# Altium integrated library CbyP.IntLib: 1144 symbols (part 5 of 6) (continued)
## LM3914N-1/NOPB (continued)

## LP28300AQVF
designator IC?
20V 6A 25mΩ@4.5V,4A 1W 1V@250uA 2 N-Channel TSSOP-8 MOSFETs ROHS; Manufacturer: LOWPOWER; So_Chan_Dan: 11; So_Chan_Cam: 0; Package: TDFN-10-EP(3x3); Name: LP28300AQVF; Mfr.Part #: LP28300AQVF
footprint TDFN-10-EP(3x3)
pins: 1 REG, 2 VIN, 3 PMID (power), 4 SW (power), 5 GND (power), 6 NTC, 7 STAT, 8 BST, 9 BAT, 10 RS, 11 GND

## LR1121IMLTRT
designator IC?
Long Range, Low Power, Multi-band LoRa Transceiver; Manufacturer: SEMTECH; Mfr.Part #: LR1121IMLTRT; LCSC Part #: C7498014; Package: QFN-32-EP(5x5)
footprint QFN-32-EP(5x5)
pins: 1 VR_PA, 2 VBAT_RF, 3 VTCXO, 4 XTA, 5 XTB, 6 ~{RESET}, 7 32K_P/DIO11, 8 32K_N/DIO10, 9 DIO9, 10 DIO8, 11 DIO7, 12 VREG, 13 GND, 14 DCC_SW, 15 VBAT, 16 DNC, 17 DNC, 18 DNC, 19 DIO6, 20 DIO5, 21 DIO4, 22 DIO3, 23 DIO2, 24 DIO1, 25 DIO0/BUSY, 26 RFIO_HF, 27 DNC, 28 DNC, 29 RFI_N_LF0, 30 RFI_P_LF0, 31 RFO_LP_LF, 32 RFO_HP_LF, 33 GND

## MAX232DR
designator IC?, comment MAX232D
120Kbps Transceiver SOIC-16 RS232 ICs ROHS; Manufacturer: Texas Instruments; Mfr.Part #: MAX232DR; Package: SOIC-16; LCSC Part #: C158068; DigiKey Part Number: 296-14619-2-ND
footprint SOIC-16
pins: 1 C1+, 2 VS+, 3 C1-, 4 C2+, 5 C2-, 6 VS-, 7 T2OUT, 8 R2IN, 9 R2OUT, 10 T2IN, 11 T1IN, 12 R1OUT, 13 R1IN, 14 T1OUT, 15 GND, 16 VCC

## MAX232ESE+T-JSM
designator IC?, comment MAX232
Transceiver 3V~5.5V SOP-16 Drivers, Receivers, Transceivers RoHS; Manufacturer: JSMSEMI; Mfr.Part #: MAX232ESE+T-JSM; Package: SOP-16; LCSC Part #: C41421781; DigiKey Part Number: NO
footprint SOIC-16
pins: 1 C1+, 2 VS+, 3 C1-, 4 C2+, 5 C2-, 6 VS-, 7 DOUT2, 8 RIN2, 9 ROUT2, 10 DIN2, 11 DIN1, 12 ROUT1, 13 RIN1, 14 DOUT1, 15 GND, 16 VCC

## MAX485ESA+T
designator IC?, comment MAX485
Transceiver 4.75V~5.25V SOIC-8 Drivers, Receivers, Transceivers RoHS; Manufacturer: MAXIM; Mfr.Part #: MAX485ESA+T; Package: SOIC-8; LCSC Part #: C19738; DigiKey Part Number: MAX485ESA+TTR-ND
footprint SOIC-8
pins: 1 RO, 2 RE#, 3 DE, 4 DI, 5 GND, 6 A, 7 B, 8 VCC

## MAX3485EESA+T
designator IC?, comment MAX3485
Transceiver Half-Duplex 3V~3.6V SOIC-8 Drivers, Receivers, Transceivers RoHS; Manufacturer: MAXIM; Mfr.Part #: MAX3485EESA+T; Package: SOIC-8; LCSC Part #: C9943; DigiKey Part Number: MAX3485EESA+TTR-ND
footprint SOIC-8
pins: 1 RO, 2 RE#, 3 DE, 4 DI, 5 GND, 6 A, 7 B, 8 VCC

## MAX98357AETE+T
designator IC?, comment MAX98357A
Tiny, Low-Cost, PCM Class D Amplifier with Class AB Performance; Manufacturer: MAXIM; Mfr.Part #: MAX98357AETE+T; Package: TQFN-16-EP(3x3); LCSC Part #: C910544
footprint TQFN-16-EP(3x3)
pins: 1 DIN, 2 GAIN_SLOT, 3 GND, 4 ~{SD_MODE}, 5 NC, 6 NC, 7 VDD, 8 VDD, 9 OUTP, 10 OUTN, 11 GND, 12 NC, 13 NC, 14 LRCLK, 15 GND, 16 BCLK, 17 GND

## MCP3204
designator IC?
12 Bits 2.7V~5.5V 100kHz SOIC-14 Analog to Digital Converters (ADC) ROHS; Manufacturer: Microchip Tech; Mfr.Part #: MCP3204-CI/SL; So_Chan_Dan: 14; So_Chna_Cam: 0; Package: SOIC-14; Name: MCP3204
footprint SOP-14
pins: 1 CH0, 2 CH1, 3 CH2, 4 CH3, 5 NC, 6 NC, 7 DGND, 8 CS#/SHDN, 9 DIN, 10 DOUT, 11 CLK, 12 AGND, 13 VREF, 14 VDD

## MIC4424YM
designator IC?
Low Edge 2 MOSFET 3A 28ns 32ns 4.5V~18V 3A SOIC-8 Gate Drivers ROHS; Manufacturer: Microchip Tech; Mfr.Part #: MIC4424YM-TR; So_Chan_Dan: 8; So_Chan_Cam: 0; Package: SOIC-8
footprint SOIC-8
pins: 1 NC, 2 INA, 3 GND, 4 INB, 5 OUTB, 6 VS, 7 OUTA, 8 NC

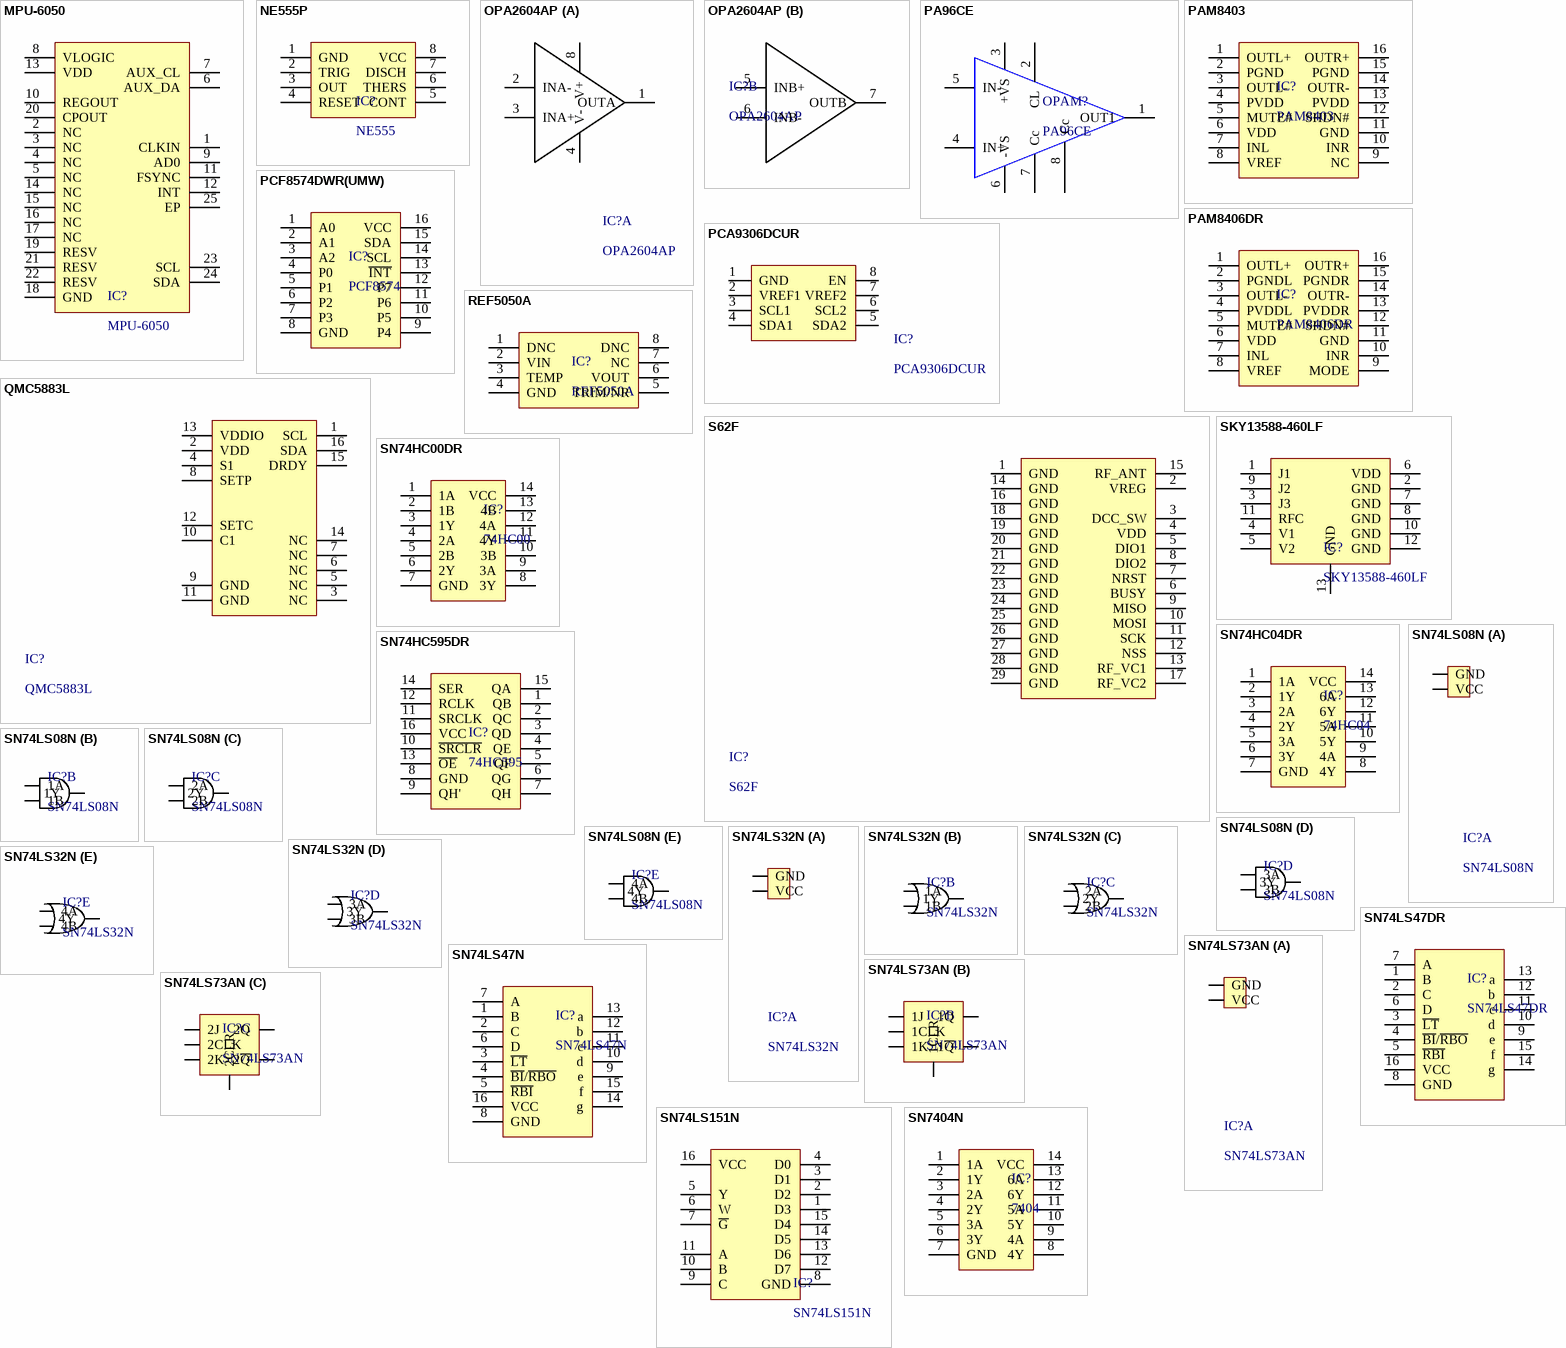
[diagram p29: symbols MPU-6050 to SN7404N]

## MPU-6050
designator IC?
Accelerometer gyroscope QFN-24-EP(4x4) Accelerometers ROHS; Manufacturer: TDK InvenSense; So_Chan_Dan: 25; So_.Chan_Cam: 0; Mfr.Part #: MPU-6050; Package: QFN-24-EP(4x4); Name: MPU-6050
footprint QFN-24-EP(4x4)
pins: 1 CLKIN, 2 NC, 3 NC, 4 NC, 5 NC, 6 AUX_DA, 7 AUX_CL, 8 VLOGIC, 9 AD0, 10 REGOUT, 11 FSYNC, 12 INT, 13 VDD, 14 NC, 15 NC, 16 NC, 17 NC, 18 GND, 19 RESV, 20 CPOUT, 21 RESV, 22 RESV, 23 SCL, 24 SDA, 25 EP

## NE555P
designator IC?, comment NE555
100kHz DIP-8 Timers / Counters ROHS; Manufacturer: Texas Instruments; Mfr.Part #: NE555P; So_Chan_Dan: 0; So_.Chan_Cam: 6; ComponentLink1Description: New link; ComponentLink1URL: https://www.lcsc.com/product-detail/Timers-Clock-Oscillators_Texas-Instruments-NE555D_C234230.html; Package: DIP-8; Name: NE555
footprint DIP-8
pins: 1 GND, 2 TRIG, 3 OUT, 4 RESET, 5 CONT, 6 THERS, 7 DISCH, 8 VCC

## OPA2604AP
designator IC?
20MHz DIP-8 FET Input Amplifiers ROHS; Manufacturer: Texas Instruments; So_Chan_Dan: 0; So_Chan_Cam: 8; Mfr.Part #: OPA2604AP; Package: DIP-8; Name: OPA2604AP
footprint DIP-8
footprint SOIC-8
part A pins: 1 OUTA, 2 INA-, 3 INA+, 4 V-, 8 V+
part B pins: 5 INB+, 6 INB-, 7 OUTB

## PA96CE
designator OPAM?
TO-3-8 Amplifiers RoHS; Manufacturer: APEX; Package: TO-3-8; Mfr.Part #: PA96CE; LCSC Part #: C18213792; ComponentLink1Description: Link; ComponentLink1URL: https://www.lcsc.com/product-detail/C18213792.html?s_z=n_PA96CE; ComponentLink2Description: Link 1; ComponentLink2URL: https://www.mouser.vn/ProductDetail/Apex-Microtechnology/PA96CE?qs=TiOZkKH1s2S6RGQQrMN02A%3D%3D&srsltid=AfmBOopWmAi7-CiaxsE3NTOhZujj8-wvrtGLD9loa2KCH2A-uqukY69L; DigiKey Part Number: NO
footprint TO-3
pins: 1 OUT1, 2 CL, 3 +VS (power), 4 IN+, 5 IN-, 6 -VS (power), 7 Cc, 8 Cc

## PAM8403
designator IC?
SOP-16 Audio Power OpAmps ROHS
footprint SOP-16
pins: 1 OUTL+, 2 PGND, 3 OUTL-, 4 PVDD, 5 MUTE#, 6 VDD, 7 INL, 8 VREF, 9 NC, 10 INR, 11 GND, 12 SHDN#, 13 PVDD, 14 OUTR-, 15 PGND, 16 OUTR+

## PAM8406DR
designator IC?
Dual Channel 5Wx2@2Ω SOIC-16 Audio Amplifiers ROHS; Manufacturer: Diodes Incorporated; So_Chan_Dan: 16; So_Chna_Cam: 0; Mfr.Part #: PAM8406DR; Package: SOIC-16; Name: PAM8406DR
footprint SOIC-16
pins: 1 OUTL+, 2 PGNDL, 3 OUTL-, 4 PVDDL, 5 MUTE#, 6 VDD, 7 INL, 8 VREF, 9 MODE, 10 INR, 11 GND, 12 SHDN#, 13 PVDDR, 14 OUTR-, 15 PGNDR, 16 OUTR+

## PCA9306DCUR
designator IC?
1 2 VSSOP-8 Translators, Level Shifters RoHS; Manufacturer: TI; Package: VSSOP-8; Mfr.Part #: PCA9306DCUR; LCSC Part #: C33196; DigiKey Part Number: 296-17988-2-ND
footprint VSSOP-8
pins: 1 GND, 2 VREF1, 3 SCL1, 4 SDA1, 5 SDA2, 6 SCL2, 7 VREF2, 8 EN

## PCF8574DWR(UMW)
designator IC?, comment PCF8574
8-Bit I/O Expander for I²C Bus; Manufacturer: UMW; Mfr.Part #: PCF8574DWR(UMW); Package: SOIC-16-300mil; LCSC Part #: C22396383
footprint SOP-16-4.4mm-1
pins: 1 A0, 2 A1, 3 A2, 4 P0, 5 P1, 6 P2, 7 P3, 8 GND, 9 P4, 10 P5, 11 P6, 12 P7, 13 ~{INT}, 14 SCL, 15 SDA, 16 VCC

## QMC5883L
designator IC?
LGA-16(3x3) 3D Magnetic Sensors ROHS; Manufacturer: QST; So_Chan_Dan: 16; So_Chan_Cam: 0; Mfr.Part #: QMC5883L; Package: LCC-16; Name: QMC5883L
footprint LCC-16
pins: 1 SCL, 2 VDD, 3 NC, 4 S1, 5 NC, 6 NC, 7 NC, 8 SETP, 9 GND, 10 C1, 11 GND, 12 SETC, 13 VDDIO, 14 NC, 15 DRDY, 16 SDA

## REF5050A
designator IC?
5V ±0.1% 5.2V~18V 10mA Fixed SOIC-8 Voltage Reference ROHS; Manufacturer: Texas Instruments; Mfr.Part #: REF5050AIDR; So_Chan_Dan: 8; So_Chan_Cam: 0; Package: SOIC-8; Name: REF5050A
footprint SOIC-8
pins: 1 DNC, 2 VIN, 3 TEMP, 4 GND, 5 TRIM/NR, 6 VOUT, 7 NC, 8 DNC

## S62F
designator IC?
The S62F can achieve a sensitivity of over -137 dBm using a TCXO and related bill of materials. The high sensitivity combined with the integrated +22 dBm(max.); Manufacturer: AcSiP; Package: LGA-29; Mfr.Part #: S62F
footprint S62F/S68F
pins: 1 GND (power), 2 VREG, 3 DCC_SW, 4 VDD, 5 DIO1, 6 BUSY, 7 NRST, 8 DIO2, 9 MISO, 10 MOSI, 11 SCK, 12 NSS, 13 RF_VC1, 14 GND, 15 RF_ANT, 16 GND, 17 RF_VC2, 18 GND, 19 GND, 20 GND, 21 GND, 22 GND, 23 GND, 24 GND, 25 GND, 26 GND, 27 GND, 28 GND, 29 GND

## SKY13588-460LF
designator IC?
0.1 to 6.0 GHz SP3T Switch; Manufacturer: SKYWORKS; Mfr.Part #: SKY13588-460LF; Package: QFN-12-EP(2x2); LCSC Part #: C2151906
footprint QFN-12-EP(2x2)
pins: 1 J1, 2 GND, 3 J3, 4 V1, 5 V2, 6 VDD, 7 GND, 8 GND, 9 J2, 10 GND, 11 RFC, 12 GND, 13 GND

## SN74HC00DR
designator IC?, comment 74HC00
2uA 2V~6V 15ns@6V,50pF SOIC-14 Gates and Inverters RoHS; Manufacturer: TI; Mfr.Part #: SN74HC00DR; Package: SOIC-14; LCSC Part #: C10090; DigiKey Part Number: 296-1187-2-ND; ComponentLink1Description: Link; ComponentLink1URL: https://www.lcsc.com/product-detail/C10090.html?s_z=n_74hc00; ComponentLink2Description: Link 1; ComponentLink2URL: https://www.digikey.com/en/products/detail/texas-instruments/SN74HC00DR/276830
footprint SOP-14
pins: 1 1A, 2 1B, 3 1Y, 4 2A, 5 2B, 6 2Y, 7 GND, 8 3Y, 9 3A, 10 3B, 11 4Y, 12 4A, 13 4B, 14 VCC

## SN74HC04DR
designator IC?, comment 74HC04
2V~6V 16ns@6V,50pF 2uA 6 1 SOIC-14 Gates and Inverters RoHS; Manufacturer: TI; Mfr.Part #: SN74HC04DR; Package: SOIC-14; LCSC Part #: C6811; DigiKey Part Number: 296-1189-2-ND; ComponentLink1Description: Link; ComponentLink1URL: https://www.lcsc.com/product-detail/C6811.html?s_z=n_74HC04; ComponentLink2Description: Link 1; ComponentLink2URL: https://www.digikey.com/en/products/detail/texas-instruments/SN74HC04DR/276832
footprint SOP-14
pins: 1 1A, 2 1Y, 3 2A, 4 2Y, 5 3A, 6 3Y, 7 GND, 8 4Y, 9 4A, 10 5Y, 11 5A, 12 6Y, 13 6A, 14 VCC

## SN74HC595DR
designator IC?, comment 74HC595
2V~6V 1 6mA 26ns@6V,50pF Serial-to-Serial or Parallel SOIC-16 Shift Registers RoHS; Manufacturer: TI; Mfr.Part #: SN74HC595DR; Package: SOIC-16; LCSC Part #: C10092; DigiKey Part Number: 296-14857-2-ND
footprint SOP-16
pins: 1 QB, 2 QC, 3 QD, 4 QE, 5 QF, 6 QG, 7 QH, 8 GND, 9 QH', 10 ~{SRCLR}, 11 SRCLK, 12 RCLK, 13 ~{OE}, 14 SER, 15 QA, 16 VCC

## SN74LS08N
designator IC?
4.75V~5.25V 4 20ns@5V,15pF With Door PDIP-14 Logic Gates ROHS; Manufacturer: Texas Instruments; So_Chan_Dan: 0; So_Chna_Cam: 14; Mfr.Part #: SN74LS08N; Package: PDIP-14; Name: SN74LS08N
footprint DIP-14
part A pins: 7 GND, 14 VCC
part B pins: 1 1A, 2 1B, 3 1Y
part C pins: 4 2A, 5 2B, 6 2Y
part D pins: 8 3Y, 9 3A, 10 3B
part E pins: 11 4Y, 12 4A, 13 4B

## SN74LS32N
designator IC?
4.75V~5.25V 4 22ns@5V,15pF ORGate PDIP-14 Logic Gates ROHS; Manufacturer: Texas Instruments; So_Chan_Dan: 0; So_Chna_Cam: 14; Mfr.Part #: SN74LS32N; Package: PDIP-14; Name: SN74LS32N
footprint DIP-14
part A pins: 7 GND, 14 VCC
part B pins: 1 1A, 2 1B, 3 1Y
part C pins: 4 2A, 5 2B, 6 2Y
part D pins: 8 3Y, 9 3A, 10 3B
part E pins: 11 4Y, 12 4A, 13 4B

## SN74LS47DR
designator IC?
SOIC-16 Digital Tube Drivers ROHS; Manufacturer: Texas Instruments; So_Chan_Dan: 16; So_Chan_Cam: 0; Mfr.Part #: SN74LS47DR; Package: SOIC-16; Name: SN74LS47
footprint SOIC-16
pins: 1 B, 2 C, 3 ~{LT}, 4 ~{BI}/~{RBO}, 5 ~{RBI}, 6 D, 7 A, 8 GND, 9 e, 10 d, 11 c, 12 b, 13 a, 14 g, 15 f, 16 VCC

## SN74LS47N
designator IC?
DIP-16 Digital Tube Drivers ROHS; Manufacturer: Texas Instruments; So_Chan_Dan: 0; So_Chan_Cam: 16; Mfr.Part #: SN74LS47N; Package: DIP-16; Name: SN74LS47N
footprint DIP-16
pins: 1 B, 2 C, 3 ~{LT}, 4 ~{BI}/~{RBO}, 5 ~{RBI}, 6 D, 7 A, 8 GND, 9 e, 10 d, 11 c, 12 b, 13 a, 14 g, 15 f, 16 VCC

## SN74LS73AN
designator IC?
4.75V~5.25V 45MHz 20ns@5V,45pF JK-Type 1 2 6mA PDIP-14 Flip Flops ROHS; Manufacturer: Texas Instruments; So_Chan_Dan: 0; So_Chna_Cam: 14; Mfr.Part #: SN74LS73AN; Package: PDIP-14; Name: SN74LS73AN
footprint DIP-14
part A pins: 4 VCC, 11 GND
part B pins: 1 1CLK, 2 1CLR, 3 1K, 12 1Q, 13 1~{Q}, 14 1J
part C pins: 5 2CLK, 6 2CLR, 7 2J, 8 2~{Q}, 9 2Q, 10 2K

## SN74LS151N
designator IC?
8mA 4.75V~5.25V 400uA PDIP-16 Signal Switches, Multiplexers, Decoders ROHS; Manufacturer: Texas Instruments; So_Chan_Dan: 0; So_Chan_Cam: 16; Mfr.Part #: SN74LS151N; Package: DIP-16; Name: SN74LS151N
footprint DIP-16
pins: 1 D3, 2 D2, 3 D1, 4 D0, 5 Y, 6 W, 7 ~{G}, 8 GND, 9 C, 10 B, 11 A, 12 D7, 13 D6, 14 D5, 15 D4, 16 VCC

## SN7404N
designator IC?, comment 7404
Six Independent Inverters - SN7404, SN74LS04, SN74S04; Manufacturer: TI; Mfr.Part #: SN7404N; Package: PDIP-14; LCSC Part #: C131919
footprint DIP-14
pins: 1 1A, 2 1Y, 3 2A, 4 2Y, 5 3A, 6 3Y, 7 GND, 8 4Y, 9 4A, 10 5Y, 11 5A, 12 6Y, 13 6A, 14 VCC

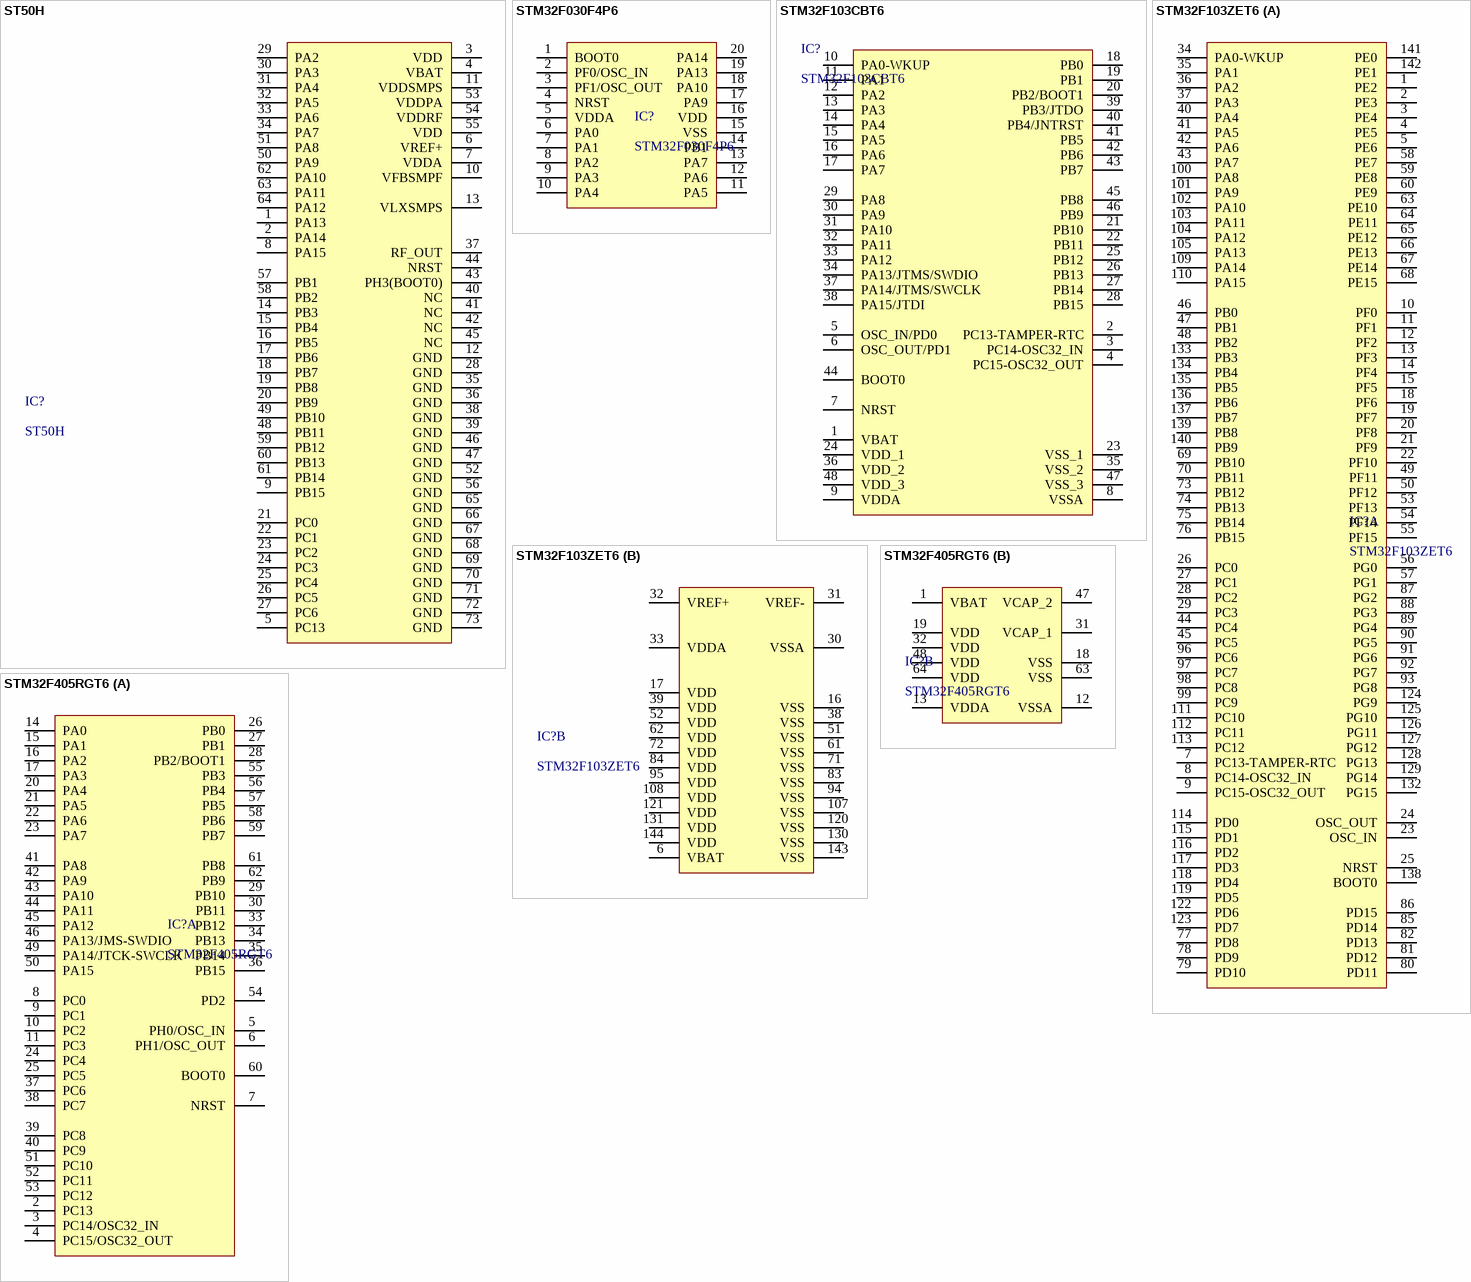
[diagram p30: symbols ST50H to STM32F405RGT6]

## ST50H
designator IC?
RF System on a Chip - SoC ST50H Module; Manufacturer: AcSiP; Package: LGA-73; Mfr.Part #: ST50H
footprint ST50 (ST50H_Recommand footprint)
pins: 1 PA13 (power), 2 PA14, 3 VDD, 4 VBAT, 5 PC13, 6 VREF+, 7 VDDA, 8 PA15, 9 PB15, 10 VFBSMPF, 11 VDDSMPS, 12 GND, 13 VLXSMPS, 14 PB3, 15 PB4, 16 PB5, 17 PB6, 18 PB7, 19 PB8, 20 PB9, 21 PC0, 22 PC1, 23 PC2, 24 PC3, 25 PC4, 26 PC5, 27 PC6, 28 GND, 29 PA2, 30 PA3, 31 PA4, 32 PA5, 33 PA6, 34 PA7, 35 GND, 36 GND, 37 RF_OUT, 38 GND, 39 GND, 40 NC, 41 NC, 42 NC, 43 PH3(BOOT0), 44 NRST, 45 NC, 46 GND, 47 GND, 48 PB11, 49 PB10, 50 PA9, 51 PA8, 52 GND, 53 VDDPA, 54 VDDRF, 55 VDD, 56 GND, 57 PB1, 58 PB2, 59 PB12, 60 PB13, 61 PB14, 62 PA10, 63 PA11, 64 PA12, 65 GND, 66 GND, 67 GND, 68 GND, 69 GND, 70 GND, 71 GND, 72 GND, 73 GND

## STM32F030F4P6
designator IC?
ARM Cortex-M0 32 Bit 48MHz 15 TSSOP-20 Microcontrollers RoHS; Manufacturer: ST; Mfr.Part #: STM32F030F4P6; Package: TSSOP-20; LCSC Part #: C32908; DigiKey Part Number: 497-14044-5-ND; ComponentLink1Description: Link; ComponentLink1URL: https://www.lcsc.com/product-detail/C32908.html?s_z=n_stm32f030f4t6&spm=wm.ssy.bg.0.xh&lcsc_vid=RlMKBl1fQlJdAlBTQgUIUgUHQFUPBlJQFlJXVl0AT1cxVlNRQ1NcUVJUR1ddUDsOAxUeFF5JWBYZEEoKFBINSQcJGk4eFQsCAgIaSgADAwAHC0slTlBdV1ZIHxUDCw%3D%3D; ComponentLink2Description: Link 1; ComponentLink2URL: https://www.digikey.com/en/products/detail/stmicroelectronics/STM32F030F4P6/4357517
footprint TSSOP-20
pins: 1 BOOT0, 2 PF0/OSC_IN, 3 PF1/OSC_OUT, 4 NRST, 5 VDDA, 6 PA0, 7 PA1, 8 PA2, 9 PA3, 10 PA4, 11 PA5, 12 PA6, 13 PA7, 14 PB1, 15 VSS, 16 VDD, 17 PA9, 18 PA10, 19 PA13, 20 PA14

## STM32F103CBT6
designator IC?
ARM-M3 72MHz 37 LQFP-48(7x7) Microcontrollers RoHS; Manufacturer: ST; Mfr.Part #: STM32F103CBT6; Package: LQFP-48(7x7); LCSC Part #: C8304; DigiKey Part Number: 497-6288-ND
footprint LQFP-48(7x7)
pins: 1 VBAT, 2 PC13-TAMPER-RTC, 3 PC14-OSC32_IN, 4 PC15-OSC32_OUT, 5 OSC_IN/PD0, 6 OSC_OUT/PD1, 7 NRST, 8 VSSA, 9 VDDA, 10 PA0-WKUP, 11 PA1, 12 PA2, 13 PA3, 14 PA4, 15 PA5, 16 PA6, 17 PA7, 18 PB0, 19 PB1, 20 PB2/BOOT1, 21 PB10, 22 PB11, 23 VSS_1, 24 VDD_1, 25 PB12, 26 PB13, 27 PB14, 28 PB15, 29 PA8, 30 PA9, 31 PA10, 32 PA11, 33 PA12, 34 PA13/JTMS/SWDIO, 35 VSS_2, 36 VDD_2, 37 PA14/JTMS/SWCLK, 38 PA15/JTDI, 39 PB3/JTDO, 40 PB4/JNTRST, 41 PB5, 42 PB6, 43 PB7, 44 BOOT0, 45 PB8, 46 PB9, 47 VSS_3, 48 VDD_3

## STM32F103ZET6
designator IC?
ARM Cortex-M3 32 Bit 72MHz 112 LQFP-144(20x20) Microcontrollers RoHS; Manufacturer: ST; Mfr.Part #: STM32F103ZET6; LCSC Part #: C8287; Package: LQFP-144(20x20); DigiKey Part Number: 497-6442-ND
footprint LQFP-144(20x20)
part A pins: 1 PE2, 2 PE3, 3 PE4, 4 PE5, 5 PE6, 7 PC13-TAMPER-RTC, 8 PC14-OSC32_IN, 9 PC15-OSC32_OUT, 10 PF0, 11 PF1, 12 PF2, 13 PF3, 14 PF4, 15 PF5, 18 PF6, 19 PF7, 20 PF8, 21 PF9, 22 PF10, 23 OSC_IN, 24 OSC_OUT, 25 NRST, 26 PC0, 27 PC1, 28 PC2, 29 PC3, 34 PA0-WKUP, 35 PA1, 36 PA2, 37 PA3, 40 PA4, 41 PA5, 42 PA6, 43 PA7, 44 PC4, 45 PC5, 46 PB0, 47 PB1, 48 PB2, 49 PF11, 50 PF12, 53 PF13, 54 PF14, 55 PF15, 56 PG0, 57 PG1, 58 PE7, 59 PE8, 60 PE9, 63 PE10, 64 PE11, 65 PE12, 66 PE13, 67 PE14, 68 PE15, 69 PB10, 70 PB11, 73 PB12, 74 PB13, 75 PB14, 76 PB15, 77 PD8, 78 PD9, 79 PD10, 80 PD11, 81 PD12, 82 PD13, 85 PD14, 86 PD15, 87 PG2, 88 PG3, 89 PG4, 90 PG5, 91 PG6, 92 PG7, 93 PG8, 96 PC6, 97 PC7, 98 PC8, 99 PC9, 100 PA8, 101 PA9, 102 PA10, 103 PA11, 104 PA12, 105 PA13, 109 PA14, 110 PA15, 111 PC10, 112 PC11, 113 PC12, 114 PD0, 115 PD1, 116 PD2, 117 PD3, 118 PD4, 119 PD5, 122 PD6, 123 PD7, 124 PG9, 125 PG10, 126 PG11, 127 PG12, 128 PG13, 129 PG14, 132 PG15, 133 PB3, 134 PB4, 135 PB5, 136 PB6, 137 PB7, 138 BOOT0, 139 PB8, 140 PB9, 141 PE0, 142 PE1
part B pins: 6 VBAT, 16 VSS, 17 VDD, 30 VSSA, 31 VREF-, 32 VREF+, 33 VDDA, 38 VSS, 39 VDD, 51 VSS, 52 VDD, 61 VSS, 62 VDD, 71 VSS, 72 VDD, 83 VSS, 84 VDD, 94 VSS, 95 VDD, 107 VSS, 108 VDD, 120 VSS, 121 VDD, 130 VSS, 131 VDD, 143 VSS, 144 VDD

## STM32F405RGT6
designator IC?
ARM Cortex-M4 32b MCU+FPU, 210DMIPS, Flash/RAM, USB OTG HS/FS, Ethernet, TIMs, ADCs, comm. interfaces & camera; Manufacturer: STMicroelectronics; Mfr.Part #: STM32F405RGT6; Package: LQFP-64(10x10); LCSC Part #: C15742
footprint LQFP-64(10x10)
part A pins: 2 PC13, 3 PC14/OSC32_IN, 4 PC15/OSC32_OUT, 5 PH0/OSC_IN, 6 PH1/OSC_OUT, 7 NRST, 8 PC0, 9 PC1, 10 PC2, 11 PC3, 14 PA0, 15 PA1, 16 PA2, 17 PA3, 20 PA4, 21 PA5, 22 PA6, 23 PA7, 24 PC4, 25 PC5, 26 PB0, 27 PB1, 28 PB2/BOOT1, 29 PB10, 30 PB11, 33 PB12, 34 PB13, 35 PB14, 36 PB15, 37 PC6, 38 PC7, 39 PC8, 40 PC9, 41 PA8, 42 PA9, 43 PA10, 44 PA11, 45 PA12, 46 PA13/JMS-SWDIO, 49 PA14/JTCK-SWCLK, 50 PA15, 51 PC10, 52 PC11, 53 PC12, 54 PD2, 55 PB3, 56 PB4, 57 PB5, 58 PB6, 59 PB7, 60 BOOT0, 61 PB8, 62 PB9
part B pins: 1 VBAT, 12 VSSA, 13 VDDA, 18 VSS, 19 VDD, 31 VCAP_1, 32 VDD, 47 VCAP_2, 48 VDD, 63 VSS, 64 VDD

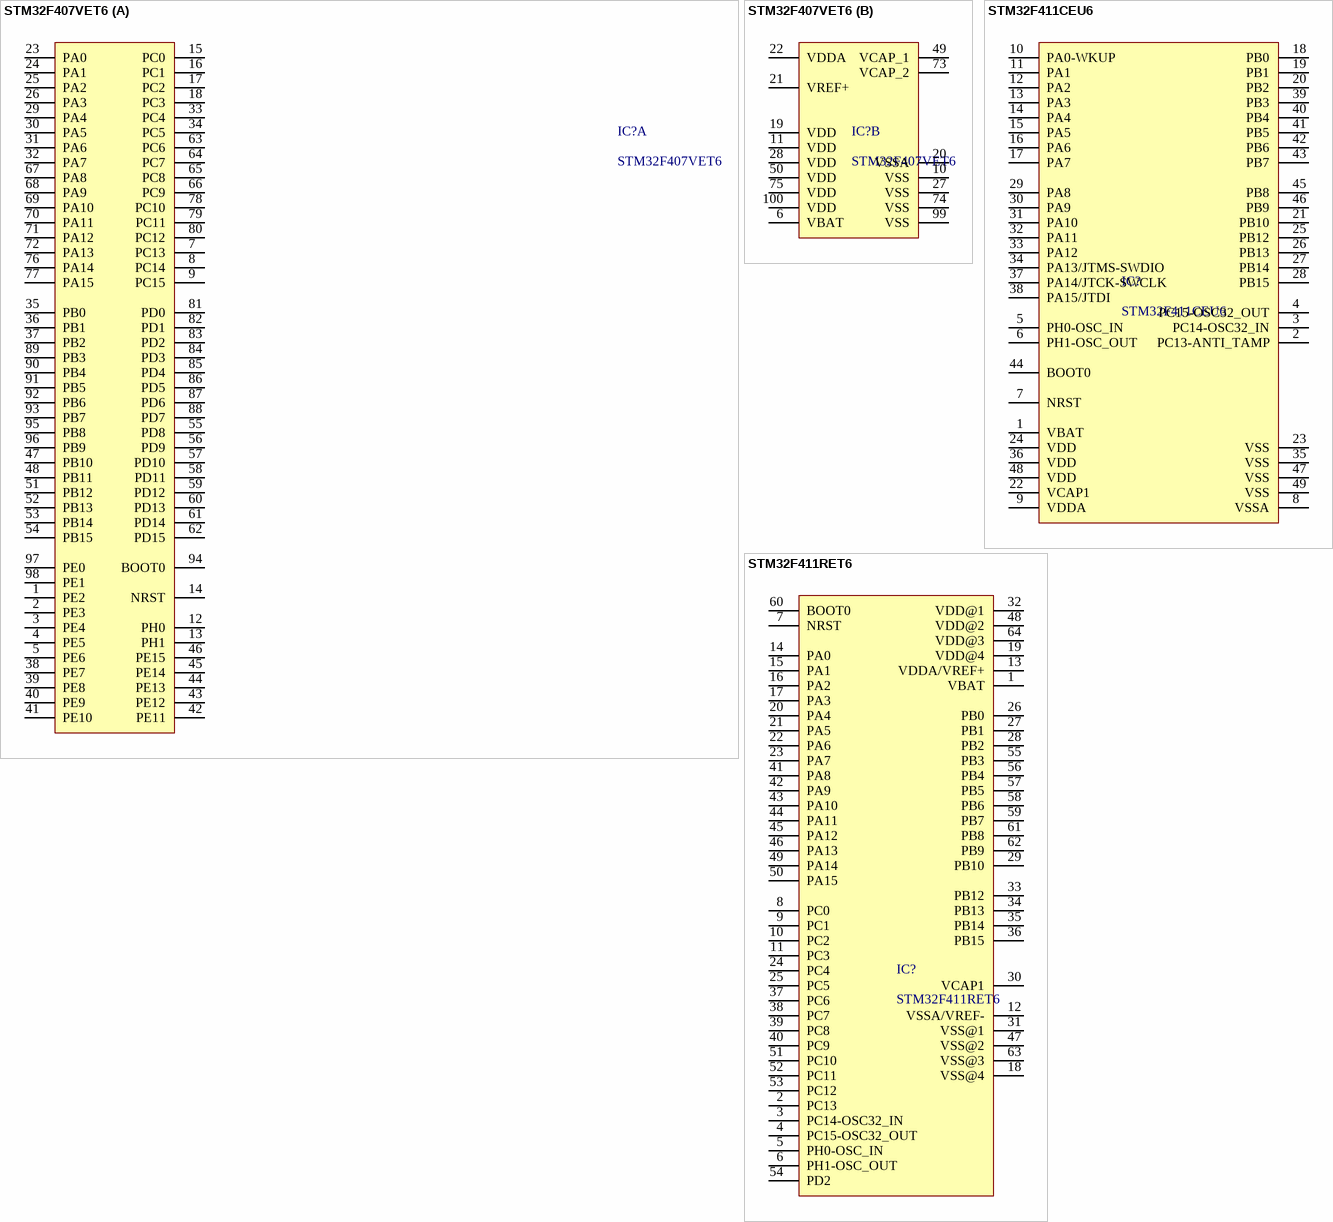
[diagram p31: symbols STM32F407VET6 to STM32F411RET6]

## STM32F407VET6
designator IC?
ARM-M4 168MHz 82 LQFP-100(14x14) Microcontrollers RoHS; Manufacturer: ST; Mfr.Part #: STM32F407VET6; Package: LQFP-100(14x14); LCSC Part #: C28730; DigiKey Part Number: 497-12075-ND; ComponentLink1Description: Link; ComponentLink1URL: https://www.lcsc.com/product-detail/C28730.html?s_z=n_STM32F407VET6; ComponentLink2Description: Link 1; ComponentLink2URL: https://www.digikey.com/en/products/detail/stmicroelectronics/STM32F407VET6/2793093?s=N4IgTCBcDaICwE4DsBaAjGADEgrCgcgCIgC6AvkA
footprint LQFP-100(14x14)
part A pins: 1 PE2, 2 PE3, 3 PE4, 4 PE5, 5 PE6, 7 PC13, 8 PC14, 9 PC15, 12 PH0, 13 PH1, 14 NRST, 15 PC0, 16 PC1, 17 PC2, 18 PC3, 23 PA0, 24 PA1, 25 PA2, 26 PA3 (power), 29 PA4, 30 PA5, 31 PA6, 32 PA7, 33 PC4, 34 PC5, 35 PB0, 36 PB1, 37 PB2, 38 PE7, 39 PE8, 40 PE9, 41 PE10, 42 PE11, 43 PE12, 44 PE13, 45 PE14, 46 PE15, 47 PB10, 48 PB11, 51 PB12, 52 PB13, 53 PB14, 54 PB15, 55 PD8, 56 PD9, 57 PD10, 58 PD11, 59 PD12, 60 PD13, 61 PD14, 62 PD15, 63 PC6, 64 PC7, 65 PC8, 66 PC9, 67 PA8, 68 PA9, 69 PA10, 70 PA11, 71 PA12, 72 PA13, 76 PA14, 77 PA15, 78 PC10, 79 PC11, 80 PC12, 81 PD0, 82 PD1, 83 PD2, 84 PD3, 85 PD4, 86 PD5, 87 PD6, 88 PD7, 89 PB3, 90 PB4, 91 PB5, 92 PB6, 93 PB7, 94 BOOT0, 95 PB8, 96 PB9, 97 PE0, 98 PE1 (power)
part B pins: 6 VBAT (power), 10 VSS (power), 11 VDD (power), 19 VDD (power), 20 VSSA (power), 21 VREF+ (power), 22 VDDA, 27 VSS (power), 28 VDD, 49 VCAP_1 (power), 50 VDD (power), 73 VCAP_2, 74 VSS (power), 75 VDD (power), 99 VSS (power), 100 VDD (power)

## STM32F411CEU6
designator IC?
ARM-M4 100MHz UFQFPN-48(7x7) Microcontrollers (MCU/MPU/SOC) ROHS; Manunfacturer: ST; Mfr.Part #: STM32F411CEU6; Package: UFQFPN-48(7x7); LCSC Part #: C60420
footprint UFQFPN-48(7x7)
pins: 1 VBAT, 2 PC13-ANTI_TAMP, 3 PC14-OSC32_IN, 4 PC15-OSC32_OUT, 5 PH0-OSC_IN, 6 PH1-OSC_OUT, 7 NRST, 8 VSSA, 9 VDDA, 10 PA0-WKUP, 11 PA1, 12 PA2, 13 PA3, 14 PA4, 15 PA5, 16 PA6, 17 PA7, 18 PB0, 19 PB1, 20 PB2, 21 PB10, 22 VCAP1, 23 VSS, 24 VDD, 25 PB12, 26 PB13, 27 PB14, 28 PB15, 29 PA8, 30 PA9, 31 PA10, 32 PA11, 33 PA12, 34 PA13/JTMS-SWDIO, 35 VSS, 36 VDD, 37 PA14/JTCK-SWCLK, 38 PA15/JTDI, 39 PB3, 40 PB4, 41 PB5, 42 PB6, 43 PB7, 44 BOOT0, 45 PB8, 46 PB9, 47 VSS, 48 VDD, 49 VSS

## STM32F411RET6
designator IC?
ARM Cortex-M4 32 Bit 100MHz 50 LQFP-64(10x10) Microcontrollers RoHS; Manufacturer: ST; Package: LQFP-64(10x10); Mfr.Part #: STM32F411RET6; LCSC Part #: C94355
footprint LQFP-64(10x10)
pins: 1 VBAT (power), 2 PC13, 3 PC14-OSC32_IN, 4 PC15-OSC32_OUT, 5 PH0-OSC_IN, 6 PH1-OSC_OUT, 7 NRST, 8 PC0, 9 PC1, 10 PC2, 11 PC3, 12 VSSA/VREF- (power), 13 VDDA/VREF+ (power), 14 PA0, 15 PA1, 16 PA2, 17 PA3, 18 VSS@4 (power), 19 VDD@4 (power), 20 PA4, 21 PA5, 22 PA6, 23 PA7, 24 PC4, 25 PC5, 26 PB0, 27 PB1, 28 PB2, 29 PB10, 30 VCAP1, 31 VSS@1 (power), 32 VDD@1 (power), 33 PB12, 34 PB13, 35 PB14, 36 PB15, 37 PC6, 38 PC7, 39 PC8, 40 PC9, 41 PA8, 42 PA9, 43 PA10, 44 PA11, 45 PA12, 46 PA13, 47 VSS@2 (power), 48 VDD@2 (power), 49 PA14, 50 PA15, 51 PC10, 52 PC11, 53 PC12, 54 PD2, 55 PB3, 56 PB4, 57 PB5, 58 PB6, 59 PB7, 60 BOOT0, 61 PB8, 62 PB9, 63 VSS@3 (power), 64 VDD@3 (power)
